# Altium footprint library TarabusLib_KOR.PcbLib: 560 footprints (part 29 of 35)
Each footprint in its own frame and in the unit in brackets; x right, y up, seen from the top. Pads: shape width x height; smd on the part's side, far side on the other; paste and mask are expansions set on the pad; w line width, h text height; cw(c..) or ccw(c..) is an arc to the next point about the centre after c.
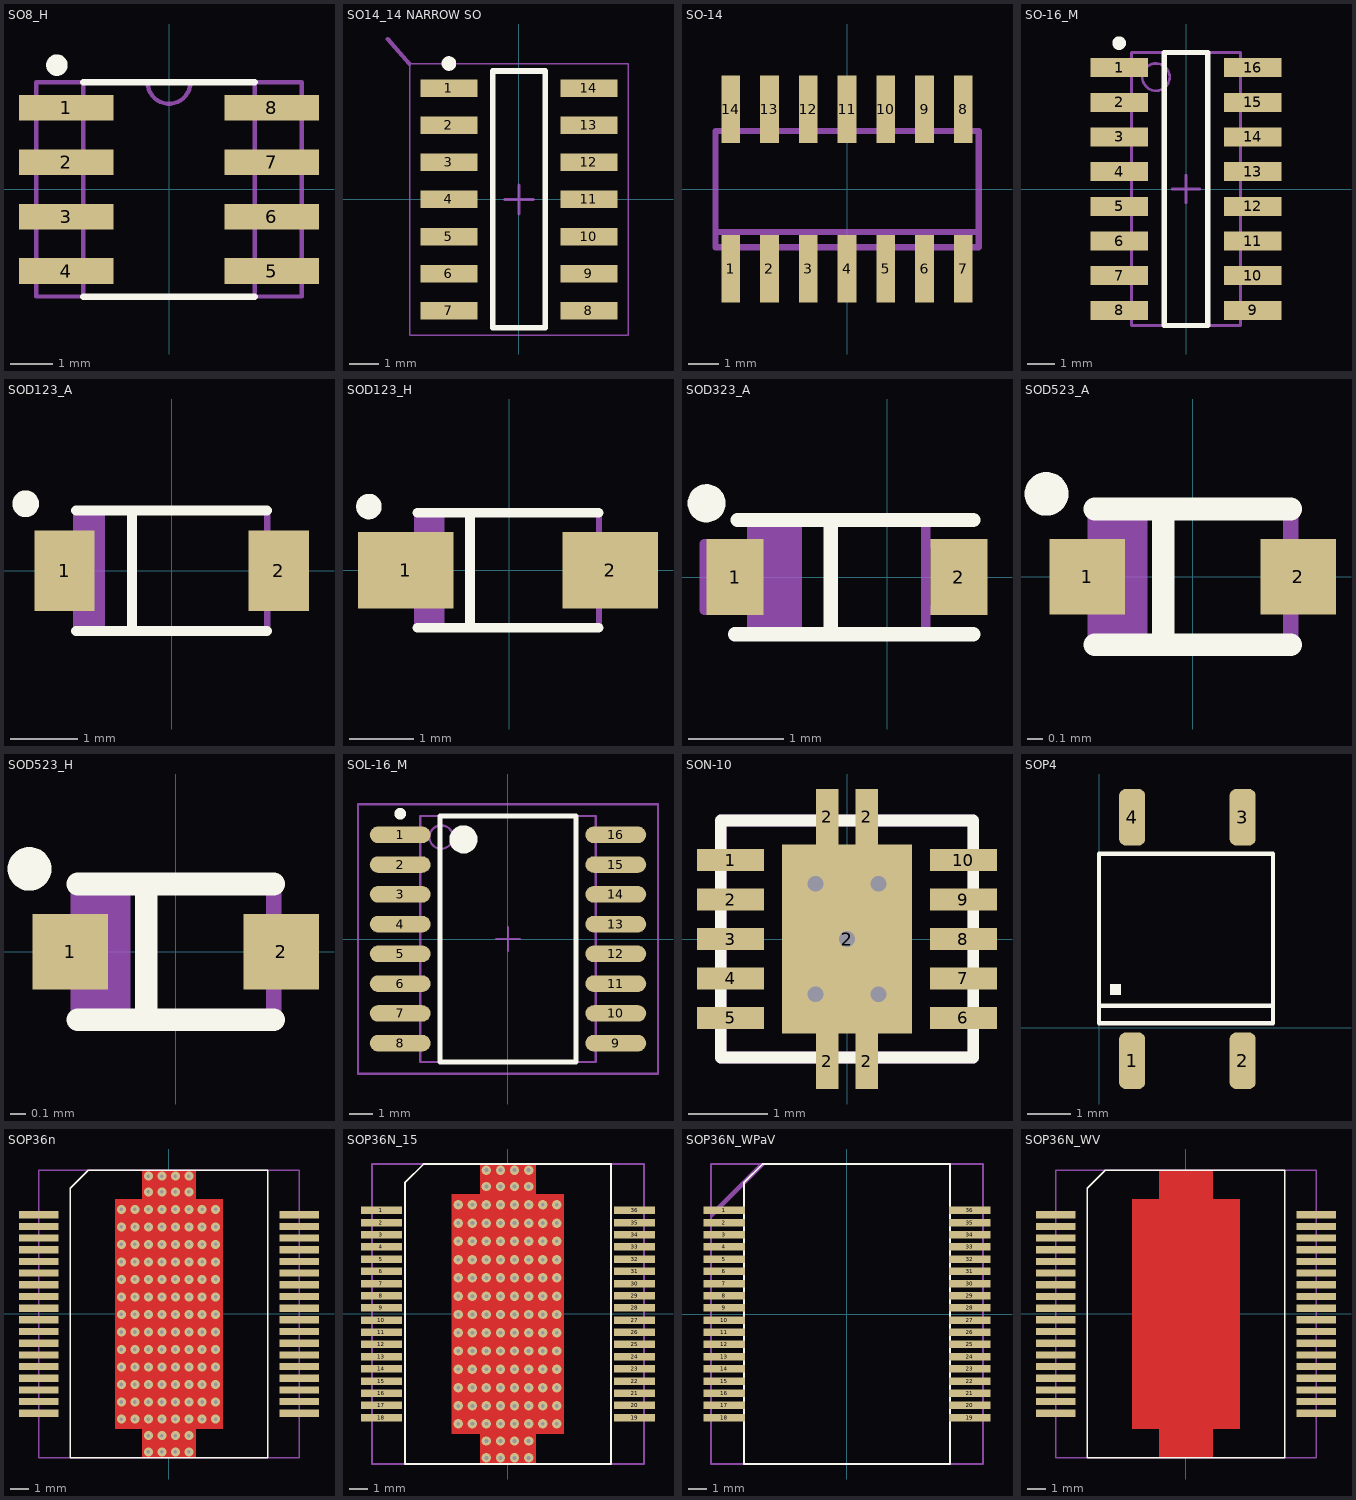
[diagram p28: the footprints below, top view; thin cyan lines are the x and y axes]

## SO8_H [mm]
height 1.75
pads (8):
  rect 2.2x0.6 smd: 1(-2.4,1.905) 2(-2.4,0.635) 3(-2.4,-0.635) 4(-2.4,-1.905) 5(2.4,-1.905) 6(2.4,-0.635) 7(2.4,0.635) 8(2.4,1.905)
Top Overlay:
  circle w0.25: c-2.615,2.9 r0.125
  lines w0.15: -2,-2.5 2,-2.5 ; -2,2.5 2,2.5
Mechanical 7:
  lines w0.1: -2,-2.5 -2,2.5 ; -0.5,2.5 ccw(c0,2.5) 0.5,2.5 ; 2,-2.5 2,2.5 ; -3.1,-2.5 -3.1,2.5 3.1,2.5 3.1,-2.5 -3.1,-2.5
Mechanical 10:
  text ".Designator" at -1,3.02 h0.8
  text ".Comment" at -0.69,-3.25 h0.6
3D body: height 1.75, standoff 0, extent -2,-2.5 2,2.5
3D body: height 1, standoff 0, extent -3.1,-2.5 -2,2.5
3D body: height 1, standoff 0, extent 2,-2.5 3.1,2.5

## SO14_14 NARROW SO [mm] "SOIC, 14-Leads, Body 8,65x3,90mm, Pitch 1,27mm, IPC Medium Density"
height 1.75
pads (14):
  rect 1.946x0.6 smd: 1(-2.4,3.81) 2(-2.4,2.54) 3(-2.4,1.27) 4(-2.4,0) 5(-2.4,-1.27) 6(-2.4,-2.54) 7(-2.4,-3.81) 8(2.4,-3.81) 9(2.4,-2.54) 10(2.4,-1.27) 11(2.4,0) 12(2.4,1.27) 13(2.4,2.54) 14(2.4,3.81)
Top Overlay:
  circle w0.25: c-2.4,4.66 r0.125
  lines w0.2: -0.9,-4.4 0.9,-4.4 0.9,4.4 -0.9,4.4 -0.9,-4.4
Mechanical 9:
  text ".Comment" at -1.75,5.05 h0.6
  text ".Designator" at -2.225,5.725 h0.8
Mechanical 11:
  lines w0.05: -3.75,-4.65 3.75,-4.65 3.75,4.65 -3.75,4.65 -3.75,-4.65
  lines w0.1: -0.5,0 0.5,0 ; 0,-0.5 0,0.5
  lines w0.15: -4.5,5.5 -3.75,4.65
3D body "User Library-SOIC14-150.step": height 1.75, standoff 0, extent -2.9,-4.275 2.9,4.275

## SO-14 [mil]
pads (14):
  rect 24x87 smd: 1(-150,-102.36) 2(-100,-102.36) 3(-50,-102.36) 4(0,-102.36) 5(50,-102.36) 6(100,-102.36) 7(150,-102.36) 8(150,103) 9(100,103) 10(50,103) 11(0,103) 12(-50,103) 13(-100,103) 14(-150,103)
Mechanical 16:
  rectangle: 41,79 60,123
  rectangle: 91,79 110,123
  rectangle: 141,79 160,123
  rectangle: 141,-122.05 160,-78.74
  rectangle: 91,-122.05 110,-78.74
  rectangle: 41,-122.05 60,-78.74
  rectangle: -159.65,79 -140.35,123
  rectangle: -109.65,79 -90.35,123
  rectangle: -59.65,79 -40.35,123
  rectangle: -9.65,79 10,123
  rectangle: -9.65,-122.05 10,-78.74
  rectangle: -59.65,-122.05 -40.35,-78.74
  rectangle: -109.65,-122.05 -90.35,-78.74
  rectangle: -159.65,-122.05 -140.35,-78.74
  lines w8: -169.49,-55.12 170,-55.12 ; -169.49,-55.12 -169.49,75 170,75 170,-55.12 ; -169.49,-55.12 -169.49,-74.8 170,-74.8 170,-55.12

## SO-16_M [mm] "16-Pin Small Outline Integrated Circuit 1.27 mm Pitch, IPC Low Density"
height 1.75
pads (16):
  rect 2.1x0.7 smd: 1(-2.45,4.445) 2(-2.45,3.175) 3(-2.45,1.905) 4(-2.45,0.635) 5(-2.45,-0.635) 6(-2.45,-1.905) 7(-2.45,-3.175) 8(-2.45,-4.445) 9(2.45,-4.445) 10(2.45,-3.175) 11(2.45,-1.905) 12(2.45,-0.635) 13(2.45,0.635) 14(2.45,1.905) 15(2.45,3.175) 16(2.45,4.445)
Top Overlay:
  circle w0.25: c-2.45,5.345 r0.125
  lines w0.2: -0.8,-5 0.8,-5 0.8,5 -0.8,5 -0.8,-5
Mechanical 9:
  text ".Designator" at -0.9,5.92 h0.8
  text ".Comment" at -0.6,-6.2 h0.6
Mechanical 11:
  circle w0.1: c-1.1,4.1 r0.5
  lines w0.1: -0.5,0 0.5,0 ; 0,-0.5 0,0.5 ; -2,-5 2,-5 2,5 -2,5 -2,-5
3D body "so16-1 (SOT109-1).STEP": height 1.78, standoff 0.01, extent -3.018,-4.985 3.118,4.985

## SOD123_A [mm]
height 1.35
pads (2):
  rect 0.9x1.2 smd: 1(-1.6,0) 2(1.6,0)
Top Overlay:
  circle w0.2: c-2.18,1 r0.1
  lines w0.15: -1.425,-0.9 1.425,-0.9 ; -1.425,0.9 1.425,0.9 ; -0.595,-0.9 -0.595,0.9
Mechanical 9:
  text ".Comment" at -0.91,-1.44 h0.6
  text ".Designator" at -0.95,1.21 h0.8
Mechanical 11:
  lines w0.1: -1.425,-0.35 -1.925,-0.35 -1.925,0.35 -1.425,0.35 ; -1.33,-0.9 -1.33,0.9 ; -1.235,-0.9 -1.235,0.9 ; -1.14,-0.9 -1.14,0.9 ; -1.045,-0.9 -1.045,0.9 ; 1.425,-0.35 1.925,-0.35 1.925,0.35 1.425,0.35 ; -1.425,-0.9 1.425,-0.9 1.425,0.9 -1.425,0.9 -1.425,-0.9
3D body "SOT-123.step": height 1.12, standoff -0.03, extent -1.875,-0.775 1.825,0.825

## SOD123_H [mm]
height 1.35
pads (2):
  rect 1.5x1.2 smd: 1(-1.62,0) 2(1.58,0)
Top Overlay:
  circle w0.2: c-2.2,1 r0.1
  lines w0.15: -1.445,-0.9 1.405,-0.9 ; -1.445,0.9 1.405,0.9 ; -0.615,-0.9 -0.615,0.9
Mechanical 7:
  lines w0.1: -1.445,-0.35 -1.945,-0.35 -1.945,0.35 -1.445,0.35 ; -1.35,-0.9 -1.35,0.9 ; -1.255,-0.9 -1.255,0.9 ; -1.16,-0.9 -1.16,0.9 ; -1.065,-0.9 -1.065,0.9 ; 1.405,-0.35 1.905,-0.35 1.905,0.35 1.405,0.35 ; -1.445,-0.9 -1.445,0.9 1.405,0.9 1.405,-0.9 -1.445,-0.9
Mechanical 10:
  text ".Comment" at -0.99,-1.44 h0.6
  text ".Designator" at -0.94,1.2 h0.8
3D body: height 1.35, standoff 0, extent -1.425,-0.9 1.425,0.9
3D body: height 0.5, standoff 0, extent -1.925,-0.35 -1.425,0.35
3D body: height 0.5, standoff 0, extent 1.425,-0.35 1.925,0.35

## SOD323_A [mm]
height 1.35
pads (2):
  rect 0.6x0.8 smd: 1(-1.6,0) 2(0.75,0)
Top Overlay:
  circle w0.2: c-1.9,0.775 r0.1
  lines w0.15: -1.6,-0.6 0.9,-0.6 ; -1.575,0.6 0.9,0.6 ; -0.595,-0.6 -0.595,0.6
Mechanical 9:
  text ".Designator" at -0.95,1.21 h0.8
  text ".Comment" at -0.91,-1.44 h0.6
Mechanical 11:
  lines w0.1: -1.425,-0.35 -1.925,-0.35 -1.925,0.35 -1.425,0.35 ; -1.35,-0.6 -1.35,0.6 ; -1.25,-0.6 -1.25,0.6 ; -1.15,-0.6 -1.15,0.6 ; -1.05,-0.6 -1.05,0.6 ; -0.95,-0.6 -0.95,0.6 ; 0.4,-0.35 0.9,-0.35 0.9,0.35 0.4,0.35 ; -1.425,-0.6 -1.425,0.6 0.4,0.6 0.4,-0.6 -1.425,-0.6
3D body "User Library-SOD323F-1.STEP": height 1, standoff 0, extent -1.675,-0.675 0.825,0.675

## SOD523_A [mm]
height 0.7
pads (2):
  rect 0.5x0.5 smd: 1(-0.7,0) 2(0.7,0)
Top Overlay:
  circle w0.15: c-0.97,0.55 r0.07
  lines w0.15: -0.65,-0.45 0.65,-0.45 ; -0.65,0.45 0.65,0.45 ; -0.195,-0.45 -0.195,0.45
Mechanical 9:
  text ".Designator" at -0.225,0.775 h0.8
  text ".Comment" at -0.775,-1.025 h0.6
Mechanical 11:
  lines w0.1: -0.65,-0.175 -0.85,-0.175 -0.85,0.175 -0.65,0.175 ; -0.55,-0.45 -0.55,0.45 ; -0.45,-0.45 -0.45,0.45 ; -0.35,-0.45 -0.35,0.45 ; 0.65,-0.175 0.85,-0.175 0.85,0.175 0.65,0.175 ; -0.65,-0.45 0.65,-0.45 0.65,0.45 -0.65,0.45 -0.65,-0.45
3D body: height 0.2, standoff 0, extent -0.85,-0.175 -0.65,0.175
3D body: height 0.2, standoff 0, extent 0.65,-0.175 0.85,0.175
3D body: height 0.7, standoff 0, extent -0.65,-0.45 0.65,0.45

## SOD523_H [mm]
height 0.7
pads (2):
  rect 0.5x0.5 smd: 1(-0.7,0) 2(0.7,0)
Top Overlay:
  circle w0.15: c-0.97,0.55 r0.07
  lines w0.15: -0.65,-0.45 0.65,-0.45 ; -0.65,0.45 0.65,0.45 ; -0.195,-0.45 -0.195,0.45
Mechanical 7:
  lines w0.1: -0.65,-0.175 -0.85,-0.175 -0.85,0.175 -0.65,0.175 ; -0.55,-0.45 -0.55,0.45 ; -0.45,-0.45 -0.45,0.45 ; -0.35,-0.45 -0.35,0.45 ; 0.65,-0.175 0.85,-0.175 0.85,0.175 0.65,0.175 ; -0.65,-0.45 0.65,-0.45 0.65,0.45 -0.65,0.45 -0.65,-0.45
Mechanical 10:
  text ".Designator" at -0.225,0.775 h0.8
  text ".Comment" at -0.775,-1.025 h0.6
3D body: height 0.2, standoff 0, extent 0.65,-0.175 0.85,0.175
3D body: height 0.2, standoff 0, extent -0.85,-0.175 -0.65,0.175
3D body: height 0.7, standoff 0, extent -0.65,-0.45 0.65,0.45

## SOL-16_M [mm] "16-Pin Small Outline Integrated Circuit 1.27 mm Pitch, IPC Low Density"
height 2.65
pads (16):
  oval 2.6x0.7 smd: 1(-4.6,4.445) 2(-4.6,3.175) 3(-4.6,1.905) 4(-4.6,0.635) 5(-4.6,-0.635) 6(-4.6,-1.905) 7(-4.6,-3.175) 8(-4.6,-4.445) 9(4.6,-4.445) 10(4.6,-3.175) 11(4.6,-1.905) 12(4.6,-0.635) 13(4.6,0.635) 14(4.6,1.905) 15(4.6,3.175) 16(4.6,4.445)
Top Overlay:
  circle w0.6: c-1.9,4.25 r0.3
  circle w0.25: c-4.6,5.345 r0.125
  lines w0.2: -2.9,-5.25 2.9,-5.25 2.9,5.25 -2.9,5.25 -2.9,-5.25
Mechanical 13:
  circle w0.1: c-2.85,4.35 r0.5
  lines w0.1: -3.75,-5.25 3.75,-5.25 3.75,5.25 -3.75,5.25 -3.75,-5.25
Mechanical 15:
  lines w0.1: -0.5,0 0.5,0 ; 0,-0.5 0,0.5 ; -6.4,-5.75 6.4,-5.75 6.4,5.75 -6.4,5.75 -6.4,-5.75
3D body: height 2.65, standoff 0, extent -3.75,-5.25 3.75,5.25

## SON-10 [mm]
pads (15):
  rect 0.85x0.28 smd: 1(-1.475,1) 2(-1.475,0.5) 3(-1.475,0) 4(-1.475,-0.5) 5(-1.475,-1) 6(1.475,-1) 7(1.475,-0.5) 8(1.475,0) 9(1.475,0.5) 10(1.475,1)
  rect 0.28x0.7 smd: 2(-0.25,-1.55) 2(-0.25,1.55) 2(0.25,-1.55) 2(0.25,1.55)
  rect 1.65x2.4 smd: 2(0,0)
via -0.4,-0.7 diameter 0.6 hole 0.2
via 0.4,-0.7 diameter 0.6 hole 0.2
via -0.4,0.7 diameter 0.6 hole 0.2
via 0.4,0.7 diameter 0.6 hole 0.2
via 0,0 diameter 0.6 hole 0.2
Top Overlay:
  lines w0.15: -1.6,-1.5 -1.6,1.5 1.6,1.5 1.6,-1.5 -1.6,-1.5
Mechanical 7:
  lines w0.15: -1.6,-1.5 -1.6,1.5 1.6,1.5 1.6,-1.5 -1.6,-1.5
3D body: height 1, standoff 0.1, extent -1.55,-1.55 1.55,1.55

## SOP4 [mm]
pads (4):
  rrect50% 0.6x1.3 smd: 1(0.762,-0.762) 2(3.302,-0.762) 3(3.302,4.838) 4(0.762,4.838)
Top Overlay:
  rectangle: 0.25,0.75 0.5,1
  lines w0.1: 0,0.5 4,0.5 ; 0,0.1 4,0.1 4,3.75 4,4 0,4 0,3.75 0,0.1
3D body "CPC1117N.STEP": height -0.44, standoff -2.62, extent -0.019,-0.798 4.07,5.298

## SOP36n [mm]
pads (36):
  rect 2.2x0.4 smd: 1(-7.25,5.525) 2(-7.25,4.875) 3(-7.25,4.225) 4(-7.25,3.575) 5(-7.25,2.925) 6(-7.25,2.275) 7(-7.25,1.625) 8(-7.25,0.975) 9(-7.25,0.325) 10(-7.25,-0.325) 11(-7.25,-0.975) 12(-7.25,-1.625) 13(-7.25,-2.275) 14(-7.25,-2.925) 15(-7.25,-3.575) 16(-7.25,-4.225) 17(-7.25,-4.875) 18(-7.25,-5.525) 19(7.25,-5.525) 20(7.25,-4.875) 21(7.25,-4.225) 22(7.25,-3.575) 23(7.25,-2.925) 24(7.25,-2.275) 25(7.25,-1.625) 26(7.25,-0.975) 27(7.25,-0.325) 28(7.25,0.325) 29(7.25,0.975) 30(7.25,1.625) 31(7.25,2.275) 32(7.25,2.925) 33(7.25,3.575) 34(7.25,4.225) 35(7.25,4.875) 36(7.25,5.525)
via -1.15,7.675 diameter 0.5 hole 0.2
via -0.4,7.675 diameter 0.5 hole 0.2
via 0.35,7.675 diameter 0.5 hole 0.2
via 1.1,7.675 diameter 0.5 hole 0.2
via 1.1,-5.85 diameter 0.5 hole 0.2
via 0.35,-5.85 diameter 0.5 hole 0.2
via -0.4,-5.85 diameter 0.5 hole 0.2
via -1.15,-5.85 diameter 0.5 hole 0.2
via 1.1,-4.9 diameter 0.5 hole 0.2
via 0.35,-4.9 diameter 0.5 hole 0.2
via -0.4,-4.9 diameter 0.5 hole 0.2
via -1.15,-4.9 diameter 0.5 hole 0.2
via 1.1,-3.925 diameter 0.5 hole 0.2
via 0.35,-3.925 diameter 0.5 hole 0.2
via -0.4,-3.925 diameter 0.5 hole 0.2
via -1.15,-3.925 diameter 0.5 hole 0.2
via 1.1,-2.95 diameter 0.5 hole 0.2
via 0.35,-2.95 diameter 0.5 hole 0.2
via -0.4,-2.95 diameter 0.5 hole 0.2
via -1.15,-2.95 diameter 0.5 hole 0.2
via 1.1,-1.975 diameter 0.5 hole 0.2
via 0.35,-1.975 diameter 0.5 hole 0.2
via -0.4,-1.975 diameter 0.5 hole 0.2
via -1.15,-1.975 diameter 0.5 hole 0.2
via 1.1,-1 diameter 0.5 hole 0.2
via 0.35,-1 diameter 0.5 hole 0.2
via -0.4,-1 diameter 0.5 hole 0.2
via -1.15,-1 diameter 0.5 hole 0.2
via 1.1,-0.025 diameter 0.5 hole 0.2
via 0.35,-0.025 diameter 0.5 hole 0.2
via -0.4,-0.025 diameter 0.5 hole 0.2
via -1.15,-0.025 diameter 0.5 hole 0.2
via 1.1,0.95 diameter 0.5 hole 0.2
via 0.35,0.95 diameter 0.5 hole 0.2
via -0.4,0.95 diameter 0.5 hole 0.2
via -1.15,0.95 diameter 0.5 hole 0.2
via 1.1,1.925 diameter 0.5 hole 0.2
via 0.35,1.925 diameter 0.5 hole 0.2
via -0.4,1.925 diameter 0.5 hole 0.2
via -1.15,1.925 diameter 0.5 hole 0.2
via 1.1,2.9 diameter 0.5 hole 0.2
via 0.35,2.9 diameter 0.5 hole 0.2
via -0.4,2.9 diameter 0.5 hole 0.2
via -1.15,2.9 diameter 0.5 hole 0.2
via 1.1,3.875 diameter 0.5 hole 0.2
via 0.35,3.875 diameter 0.5 hole 0.2
via -0.4,3.875 diameter 0.5 hole 0.2
via -1.15,3.875 diameter 0.5 hole 0.2
via 1.1,4.85 diameter 0.5 hole 0.2
via 0.35,4.85 diameter 0.5 hole 0.2
via -0.4,4.85 diameter 0.5 hole 0.2
via -1.15,4.85 diameter 0.5 hole 0.2
via 1.1,5.825 diameter 0.5 hole 0.2
via 0.35,5.825 diameter 0.5 hole 0.2
via -0.4,5.825 diameter 0.5 hole 0.2
via -1.15,5.825 diameter 0.5 hole 0.2
via 1.1,6.8 diameter 0.5 hole 0.2
via 0.35,6.8 diameter 0.5 hole 0.2
via -0.4,6.8 diameter 0.5 hole 0.2
via -1.15,6.8 diameter 0.5 hole 0.2
via -1.15,-6.775 diameter 0.5 hole 0.2
via -0.4,-6.775 diameter 0.5 hole 0.2
via 0.35,-6.775 diameter 0.5 hole 0.2
via 1.1,-6.775 diameter 0.5 hole 0.2
via -1.15,-7.675 diameter 0.5 hole 0.2
via -0.4,-7.675 diameter 0.5 hole 0.2
via 0.35,-7.675 diameter 0.5 hole 0.2
via 1.1,-7.675 diameter 0.5 hole 0.2
via -2.65,5.825 diameter 0.5 hole 0.2
via -1.9,5.825 diameter 0.5 hole 0.2
via -2.65,4.85 diameter 0.5 hole 0.2
via -1.9,4.85 diameter 0.5 hole 0.2
via -2.65,3.875 diameter 0.5 hole 0.2
via -1.9,3.875 diameter 0.5 hole 0.2
via -2.65,2.9 diameter 0.5 hole 0.2
via -1.9,2.9 diameter 0.5 hole 0.2
via -2.65,1.925 diameter 0.5 hole 0.2
via -1.9,1.925 diameter 0.5 hole 0.2
via -2.65,0.95 diameter 0.5 hole 0.2
via -1.9,0.95 diameter 0.5 hole 0.2
via -2.65,-0.025 diameter 0.5 hole 0.2
via -1.9,-0.025 diameter 0.5 hole 0.2
via -2.65,-1 diameter 0.5 hole 0.2
via -1.9,-1 diameter 0.5 hole 0.2
via -2.65,-1.975 diameter 0.5 hole 0.2
via -1.9,-1.975 diameter 0.5 hole 0.2
via -2.65,-2.95 diameter 0.5 hole 0.2
via -1.9,-2.95 diameter 0.5 hole 0.2
via -2.65,-3.925 diameter 0.5 hole 0.2
via -1.9,-3.925 diameter 0.5 hole 0.2
via -2.65,-4.9 diameter 0.5 hole 0.2
via -1.9,-4.9 diameter 0.5 hole 0.2
via -2.65,-5.85 diameter 0.5 hole 0.2
via -1.9,-5.85 diameter 0.5 hole 0.2
via 1.85,5.825 diameter 0.5 hole 0.2
via 2.6,5.825 diameter 0.5 hole 0.2
via 1.85,4.85 diameter 0.5 hole 0.2
via 2.6,4.85 diameter 0.5 hole 0.2
via 1.85,3.875 diameter 0.5 hole 0.2
via 2.6,3.875 diameter 0.5 hole 0.2
via 1.85,2.9 diameter 0.5 hole 0.2
via 2.6,2.9 diameter 0.5 hole 0.2
via 1.85,1.925 diameter 0.5 hole 0.2
via 2.6,1.925 diameter 0.5 hole 0.2
via 1.85,0.95 diameter 0.5 hole 0.2
via 2.6,0.95 diameter 0.5 hole 0.2
via 1.85,-0.025 diameter 0.5 hole 0.2
via 2.6,-0.025 diameter 0.5 hole 0.2
via 1.85,-1 diameter 0.5 hole 0.2
via 2.6,-1 diameter 0.5 hole 0.2
via 1.85,-1.975 diameter 0.5 hole 0.2
via 2.6,-1.975 diameter 0.5 hole 0.2
via 1.85,-2.95 diameter 0.5 hole 0.2
via 2.6,-2.95 diameter 0.5 hole 0.2
via 1.85,-3.925 diameter 0.5 hole 0.2
via 2.6,-3.925 diameter 0.5 hole 0.2
via 1.85,-4.9 diameter 0.5 hole 0.2
via 2.6,-4.9 diameter 0.5 hole 0.2
via 1.85,-5.85 diameter 0.5 hole 0.2
via 2.6,-5.85 diameter 0.5 hole 0.2
Top Layer:
  rectangle: -3,-6.4 3,6.4
  rectangle: -1.5,6.4 1.5,8
  rectangle: -1.5,-8 1.5,-6.4
Top Overlay:
  lines w0.1: -5.5,-8 -5.5,7 -4.5,8 5.5,8 5.5,-8 -5.5,-8
Mechanical 7:
  lines w0.1: -7.25,-8 -7.25,8 7.25,8 7.25,-8 -7.25,-8
Mechanical 10:
  text ".Designator" at -1.4,-9.1 h0.7
  text ".Comment" at -1.527,8.85 h0.7
3D body: height 2, standoff 0, extent 5.5,-5.825 7.25,5.725
3D body: height 2, standoff 0, extent -7.25,-5.825 -5.5,5.725
3D body: height 3.6, standoff 0, extent -5.525,-8 5.5,8

## SOP36N_15 [mm]
pads (36):
  rect 2.2x0.4 smd: 1(-6.75,5.525) 2(-6.75,4.875) 3(-6.75,4.225) 4(-6.75,3.575) 5(-6.75,2.925) 6(-6.75,2.275) 7(-6.75,1.625) 8(-6.75,0.975) 9(-6.75,0.325) 10(-6.75,-0.325) 11(-6.75,-0.975) 12(-6.75,-1.625) 13(-6.75,-2.275) 14(-6.75,-2.925) 15(-6.75,-3.575) 16(-6.75,-4.225) 17(-6.75,-4.875) 18(-6.75,-5.525) 19(6.75,-5.525) 20(6.75,-4.875) 21(6.75,-4.225) 22(6.75,-3.575) 23(6.75,-2.925) 24(6.75,-2.275) 25(6.75,-1.625) 26(6.75,-0.975) 27(6.75,-0.325) 28(6.75,0.325) 29(6.75,0.975) 30(6.75,1.625) 31(6.75,2.275) 32(6.75,2.925) 33(6.75,3.575) 34(6.75,4.225) 35(6.75,4.875) 36(6.75,5.525)
via 2.6,-5.85 diameter 0.5 hole 0.2
via 1.85,-5.85 diameter 0.5 hole 0.2
via 2.6,-4.9 diameter 0.5 hole 0.2
via 1.85,-4.9 diameter 0.5 hole 0.2
via 2.6,-3.925 diameter 0.5 hole 0.2
via 1.85,-3.925 diameter 0.5 hole 0.2
via 2.6,-2.95 diameter 0.5 hole 0.2
via 1.85,-2.95 diameter 0.5 hole 0.2
via 2.6,-1.975 diameter 0.5 hole 0.2
via 1.85,-1.975 diameter 0.5 hole 0.2
via 2.6,-1 diameter 0.5 hole 0.2
via 1.85,-1 diameter 0.5 hole 0.2
via 2.6,-0.025 diameter 0.5 hole 0.2
via 1.85,-0.025 diameter 0.5 hole 0.2
via 2.6,0.95 diameter 0.5 hole 0.2
via 1.85,0.95 diameter 0.5 hole 0.2
via 2.6,1.925 diameter 0.5 hole 0.2
via 1.85,1.925 diameter 0.5 hole 0.2
via 2.6,2.9 diameter 0.5 hole 0.2
via 1.85,2.9 diameter 0.5 hole 0.2
via 2.6,3.875 diameter 0.5 hole 0.2
via 1.85,3.875 diameter 0.5 hole 0.2
via 2.6,4.85 diameter 0.5 hole 0.2
via 1.85,4.85 diameter 0.5 hole 0.2
via 2.6,5.825 diameter 0.5 hole 0.2
via 1.85,5.825 diameter 0.5 hole 0.2
via -1.9,-5.85 diameter 0.5 hole 0.2
via -2.65,-5.85 diameter 0.5 hole 0.2
via -1.9,-4.9 diameter 0.5 hole 0.2
via -2.65,-4.9 diameter 0.5 hole 0.2
via -1.9,-3.925 diameter 0.5 hole 0.2
via -2.65,-3.925 diameter 0.5 hole 0.2
via -1.9,-2.95 diameter 0.5 hole 0.2
via -2.65,-2.95 diameter 0.5 hole 0.2
via -1.9,-1.975 diameter 0.5 hole 0.2
via -2.65,-1.975 diameter 0.5 hole 0.2
via -1.9,-1 diameter 0.5 hole 0.2
via -2.65,-1 diameter 0.5 hole 0.2
via -1.9,-0.025 diameter 0.5 hole 0.2
via -2.65,-0.025 diameter 0.5 hole 0.2
via -1.9,0.95 diameter 0.5 hole 0.2
via -2.65,0.95 diameter 0.5 hole 0.2
via -1.9,1.925 diameter 0.5 hole 0.2
via -2.65,1.925 diameter 0.5 hole 0.2
via -1.9,2.9 diameter 0.5 hole 0.2
via -2.65,2.9 diameter 0.5 hole 0.2
via -1.9,3.875 diameter 0.5 hole 0.2
via -2.65,3.875 diameter 0.5 hole 0.2
via -1.9,4.85 diameter 0.5 hole 0.2
via -2.65,4.85 diameter 0.5 hole 0.2
via -1.9,5.825 diameter 0.5 hole 0.2
via -2.65,5.825 diameter 0.5 hole 0.2
via 1.1,-7.675 diameter 0.5 hole 0.2
via 0.35,-7.675 diameter 0.5 hole 0.2
via -0.4,-7.675 diameter 0.5 hole 0.2
via -1.15,-7.675 diameter 0.5 hole 0.2
via 1.1,-6.775 diameter 0.5 hole 0.2
via 0.35,-6.775 diameter 0.5 hole 0.2
via -0.4,-6.775 diameter 0.5 hole 0.2
via -1.15,-6.775 diameter 0.5 hole 0.2
via -1.15,6.8 diameter 0.5 hole 0.2
via -0.4,6.8 diameter 0.5 hole 0.2
via 0.35,6.8 diameter 0.5 hole 0.2
via 1.1,6.8 diameter 0.5 hole 0.2
via -1.15,5.825 diameter 0.5 hole 0.2
via -0.4,5.825 diameter 0.5 hole 0.2
via 0.35,5.825 diameter 0.5 hole 0.2
via 1.1,5.825 diameter 0.5 hole 0.2
via -1.15,4.85 diameter 0.5 hole 0.2
via -0.4,4.85 diameter 0.5 hole 0.2
via 0.35,4.85 diameter 0.5 hole 0.2
via 1.1,4.85 diameter 0.5 hole 0.2
via -1.15,3.875 diameter 0.5 hole 0.2
via -0.4,3.875 diameter 0.5 hole 0.2
via 0.35,3.875 diameter 0.5 hole 0.2
via 1.1,3.875 diameter 0.5 hole 0.2
via -1.15,2.9 diameter 0.5 hole 0.2
via -0.4,2.9 diameter 0.5 hole 0.2
via 0.35,2.9 diameter 0.5 hole 0.2
via 1.1,2.9 diameter 0.5 hole 0.2
via -1.15,1.925 diameter 0.5 hole 0.2
via -0.4,1.925 diameter 0.5 hole 0.2
via 0.35,1.925 diameter 0.5 hole 0.2
via 1.1,1.925 diameter 0.5 hole 0.2
via -1.15,0.95 diameter 0.5 hole 0.2
via -0.4,0.95 diameter 0.5 hole 0.2
via 0.35,0.95 diameter 0.5 hole 0.2
via 1.1,0.95 diameter 0.5 hole 0.2
via -1.15,-0.025 diameter 0.5 hole 0.2
via -0.4,-0.025 diameter 0.5 hole 0.2
via 0.35,-0.025 diameter 0.5 hole 0.2
via 1.1,-0.025 diameter 0.5 hole 0.2
via -1.15,-1 diameter 0.5 hole 0.2
via -0.4,-1 diameter 0.5 hole 0.2
via 0.35,-1 diameter 0.5 hole 0.2
via 1.1,-1 diameter 0.5 hole 0.2
via -1.15,-1.975 diameter 0.5 hole 0.2
via -0.4,-1.975 diameter 0.5 hole 0.2
via 0.35,-1.975 diameter 0.5 hole 0.2
via 1.1,-1.975 diameter 0.5 hole 0.2
via -1.15,-2.95 diameter 0.5 hole 0.2
via -0.4,-2.95 diameter 0.5 hole 0.2
via 0.35,-2.95 diameter 0.5 hole 0.2
via 1.1,-2.95 diameter 0.5 hole 0.2
via -1.15,-3.925 diameter 0.5 hole 0.2
via -0.4,-3.925 diameter 0.5 hole 0.2
via 0.35,-3.925 diameter 0.5 hole 0.2
via 1.1,-3.925 diameter 0.5 hole 0.2
via -1.15,-4.9 diameter 0.5 hole 0.2
via -0.4,-4.9 diameter 0.5 hole 0.2
via 0.35,-4.9 diameter 0.5 hole 0.2
via 1.1,-4.9 diameter 0.5 hole 0.2
via -1.15,-5.85 diameter 0.5 hole 0.2
via -0.4,-5.85 diameter 0.5 hole 0.2
via 0.35,-5.85 diameter 0.5 hole 0.2
via 1.1,-5.85 diameter 0.5 hole 0.2
via 1.1,7.675 diameter 0.5 hole 0.2
via 0.35,7.675 diameter 0.5 hole 0.2
via -0.4,7.675 diameter 0.5 hole 0.2
via -1.15,7.675 diameter 0.5 hole 0.2
Top Layer:
  rectangle: -1.5,-8 1.5,-6.4
  rectangle: -1.5,6.4 1.5,8
  rectangle: -3,-6.4 3,6.4
Top Overlay:
  lines w0.1: -5.5,-8 5.5,-8 5.5,8 -4.5,8 -5.5,7 -5.5,-8
Mechanical 7:
  lines w0.1: -7.25,-8 7.25,-8 7.25,8 -7.25,8 -7.25,-8
Mechanical 10:
  text ".Comment" at -1.527,8.85 h0.7
  text ".Designator" at -1.4,-9.1 h0.7
3D body: height 3.6, standoff 0, extent -5.525,-8 5.5,8
3D body: height 2, standoff 0, extent -7.25,-5.825 -5.5,5.725
3D body: height 2, standoff 0, extent 5.5,-5.825 7.25,5.725

## SOP36N_WPaV [mm]
pads (36):
  rect 2.2x0.4 smd: 1(-6.55,5.525) 2(-6.55,4.875) 3(-6.55,4.225) 4(-6.55,3.575) 5(-6.55,2.925) 6(-6.55,2.275) 7(-6.55,1.625) 8(-6.55,0.975) 9(-6.55,0.325) 10(-6.55,-0.325) 11(-6.55,-0.975) 12(-6.55,-1.625) 13(-6.55,-2.275) 14(-6.55,-2.925) 15(-6.55,-3.575) 16(-6.55,-4.225) 17(-6.55,-4.875) 18(-6.55,-5.525) 19(6.55,-5.525) 20(6.55,-4.875) 21(6.55,-4.225) 22(6.55,-3.575) 23(6.55,-2.925) 24(6.55,-2.275) 25(6.55,-1.625) 26(6.55,-0.975) 27(6.55,-0.325) 28(6.55,0.325) 29(6.55,0.975) 30(6.55,1.625) 31(6.55,2.275) 32(6.55,2.925) 33(6.55,3.575) 34(6.55,4.225) 35(6.55,4.875) 36(6.55,5.525)
Top Overlay:
  lines w0.1: -5.5,-8 -5.5,7 -4.5,8 5.5,8 5.5,-8 -5.5,-8
Mechanical 7:
  lines w0.1: -7.242,5.267 -4.517,7.992 ; -7.242,5.367 -4.63,7.98 ; -7.217,5.192 -4.417,7.992 ; -7.25,-8 -7.25,8 7.25,8 7.25,-8 -7.25,-8
Mechanical 10:
  text ".Designator" at -1.4,-9.1 h0.7
  text ".Comment" at -1.527,8.85 h0.7
3D body: height 2, standoff 0, extent 5.5,-5.825 7.25,5.725
3D body: height 2, standoff 0, extent -7.25,-5.825 -5.5,5.725
3D body: height 3.6, standoff 0, extent -5.525,-8 5.5,8

## SOP36N_WV [mm]
pads (36):
  rect 2.2x0.4 smd: 1(-7.25,5.525) 2(-7.25,4.875) 3(-7.25,4.225) 4(-7.25,3.575) 5(-7.25,2.925) 6(-7.25,2.275) 7(-7.25,1.625) 8(-7.25,0.975) 9(-7.25,0.325) 10(-7.25,-0.325) 11(-7.25,-0.975) 12(-7.25,-1.625) 13(-7.25,-2.275) 14(-7.25,-2.925) 15(-7.25,-3.575) 16(-7.25,-4.225) 17(-7.25,-4.875) 18(-7.25,-5.525) 19(7.25,-5.525) 20(7.25,-4.875) 21(7.25,-4.225) 22(7.25,-3.575) 23(7.25,-2.925) 24(7.25,-2.275) 25(7.25,-1.625) 26(7.25,-0.975) 27(7.25,-0.325) 28(7.25,0.325) 29(7.25,0.975) 30(7.25,1.625) 31(7.25,2.275) 32(7.25,2.925) 33(7.25,3.575) 34(7.25,4.225) 35(7.25,4.875) 36(7.25,5.525)
Top Layer:
  rectangle: -1.5,-8 1.5,-6.4
  rectangle: -1.5,6.4 1.5,8
  rectangle: -3,-6.4 3,6.4
Top Overlay:
  lines w0.1: -5.5,-8 5.5,-8 5.5,8 -4.5,8 -5.5,7 -5.5,-8
Mechanical 7:
  lines w0.1: -7.25,-8 7.25,-8 7.25,8 -7.25,8 -7.25,-8
Mechanical 10:
  text ".Comment" at -1.527,8.85 h0.7
  text ".Designator" at -1.4,-9.1 h0.7
3D body: height 3.6, standoff 0, extent -5.525,-8 5.5,8
3D body: height 2, standoff 0, extent -7.25,-5.825 -5.5,5.725
3D body: height 2, standoff 0, extent 5.5,-5.825 7.25,5.725